# Altium integrated library OMID_DXP_LIB93.IntLib: 684 symbols (part 4 of 5) (continued)
## STM32F103CBT6 (continued)

## STM32F103RBT6
designator U?
STM32 ARM-based 32-bit MCU with 128 Kbytes Flash, 64-pin LQFP, Industrial Temperature; Published: 30-May-2008; DatasheetVersion: rev6, Mar-2008; PackageVersion: Mar-2008; PackageReference: LQFP64; Publisher: Altium Limited; PackageDescription: 64-Pin Low-Profile Quad Flat Pack, 10 x 10 mm Body, 0.5 mm Pitch (LQFP64); ComponentLink1Description: Manufacturer Link; ComponentLink1URL: www.st.com/stm32; ComponentLink2Description: Datasheet; ComponentLink2URL: http://www.st.com/stonline/products/literature/ds/13587.pdf
footprint LQFP64_N (Thin QFP, 64-Leads, Body 10x10mm, Pitch 0.5mm, IPC Medium Density)
footprint LQFP64_L (Thin QFP, 64-Leads, Body 10x10mm, Pitch 0.5mm, IPC High Density)
footprint LQFP64_M (Thin QFP, 64-Leads, Body 10x10mm, Pitch 0.5mm, IPC Low Density)
pins: 1 VBAT (power), 2 PC13-TAMPER-RTC (io), 3 PC14-OSC32_IN (io), 4 PC15-OSC32_OUT (io), 5 OSC_IN/PD0 (in), 6 OSC_OUT/PD1 (out), 7 NRST (io), 8 ADC10/PC0 (io), 9 ADC11/PC1 (io), 10 ADC12/PC2 (io), 11 ADC13/PC3 (io), 12 VSSA (power), 13 VDDA (power), 14 PA0/ADC0/TIM2-1/WKUP (io), 15 PA1/ADC1/TIM2-2 (io), 16 PA2/ADC2/TIM2-3 (io), 17 PA3/ADC3/TIM2-4/RX2 (io), 18 VSS_4 (power), 19 VDD_4 (power), 20 PA4/ADC4/SS1 (io), 21 PA5/ADC5/SCK1 (io), 22 PA6/ADC6/TIM3-1/MI1 (io), 23 PA7/ADC7/TIM3-2/MO1 (io), 24 ADC14/PC4 (io), 25 ADC15/PC5 (io), 26 ADC8/TIM3/B0 (io), 27 ADC9/TIM3-4/PB1 (io), 28 PB2/BOOT1 (io), 29 SCL2/TX3/TIM2-3/PB10 (io), 30 SDA2/RX3/TIM2-4/PB11 (io), 31 VSS_1 (power), 32 VDD_1 (power), 33 SS2/PB12 (io), 34 SCK2/TIM1-1/PB13 (io), 35 MISO2/TIM1-2/PB14 (io), 36 MOSI2/TIM1-3/PB15 (io), 37 PC6/TIM3-1 (io), 38 PC7/TIM3-2 (io), 39 PC8/TIM3-3 (io), 40 PC9/TIM3-4 (io), 41 PA8/TIM1-1 (io), 42 PA9/TIM1-2/TX1 (io), 43 PA10/TIM1-3/RX1 (io), 44 PA11/TIM1-2/DM (io), 45 PA12/USB-DP (io), 46 PA13/JTMS/SWDIO (io), 47 VSS_2 (power), 48 VDD_2 (power), 49 PA14/JTCK/SWCLK (io), 50 PA15/JTDI (io), 51 PC10/TX3 (io), 52 PC11/RX3 (io), 53 PC12 (io), 54 PD2 (io), 55 PB3/JTDO (io), 56 PB4/JNTRST (io), 57 PB5/TIM3-2 (io), 58 PB6/SCL1-TIM4-1 (io), 59 PB7/SDA1-TIM4-2 (io), 60 BOOT0 (in), 61 PB8/TIM4-3/CAN-RX (io), 62 PB9/TIM4-4/CAN-TX (io), 63 VSS_3 (power), 64 VDD_3 (power)

## STM32F103TBU6
designator U?
STM32 ARM-based 32-bit MCU with 128 Kbytes Flash, 36pin LQFP, Industrial Temperature; Published: 30-May-2016; DatasheetVersion: rev6, Mar-2016; PackageVersion: Mar-2008; PackageReference: QFNP36; Publisher: Altium Limited; PackageDescription: 36-Pin Low-Profile Quad Flat Pack, 6 x 6 mm Body, 0.5 mm Pitch (QFN36); ComponentLink1Description: Manufacturer Link; ComponentLink1URL: www.st.com/stm32; ComponentLink2Description: Datasheet; ComponentLink2URL: http://www.st.com/stonline/products/literature/ds/13587.pdf
footprint QFN36 (QFN, 36-Leads, Body 6x6mm, Pitch 0.5mm, IPC High Density)
pins: 1 VDD_3 (power), 2 OSC_IN/PD0 (in), 3 OSC_OUT/PD1 (out), 4 NRST (io), 5 VSS_A (power), 6 VDD_A (power), 7 PA0/WKUP/UART2_CTS/ADC12_IN0/TIM2_CH1_ETR (io), 8 PA1/UART2_RTS/ADC12_IN1/TIM2_CH3 (io), 9 PA2/UART2_TX/ADC12_IN2/TIM2_CH3 (io), 10 PA3/UART2_RX/ADC12_IN3/TIM2_CH4 (io), 11 PA4/SPI1_NSS/UART2_CK/ADC12_IN4 (io), 12 PA5/SPI1_SCK/ADC12_IN5 (io), 13 PA6/SPI1_MISO/ADC12_IN6/TIM3_CH1/TIM1_BKIN (io), 14 PA7/SPI1_MOSI/ADC12_IN7/TIM3_CH2/TIM1_CH1N (io), 15 PB0/ADC12_IN8/TIM3_CH3/TIM1_CH2N (io), 16 PB1/ADC12_IN9/TIM3_CH4/TIM1_CH3N (io), 17 PB2/BOOT1 (io), 18 VSS_1 (power), 19 VDD_1 (power), 20 PA8/UART1_CK/TIM1_CH1/MCO (io), 21 PA9/UART1_TX/TIM1_CH2 (io), 22 PA10/UART1_RX/TIM1_CH3 (io), 23 PA11/UART1_CTS/USBDM/CAN_RX/TIM1_CH4 (io), 24 PA12/UART1_RTS/USNDP/CAN_TX/TIM1_ETR (io), 25 PA13/JTMS/SWDIO (io), 26 VSS_2 (power), 27 VDD_2 (power), 28 PA14/JTCK/SWCLK (io), 29 PA15/JTDI/TIM2_CH1_ETR/SPI1_NSS (io), 30 PB3/JTDO/TIM2_CH2/SPI1_SCK (io), 31 PB4/NJTRST/TIM3_CH1/SPI1_MISO (io), 32 PB5/I2C1_SMBAI/TIM3_CH2/SPI1_MOSI (io), 33 PB6/I2C1_SCL/TIM4_CH1/UART1_TX (io), 34 PB7/I2C1_SDA/TIM4_CH2/UART1_RX (io), 35 BOOT0 (in), 36 VSS_3 (power)

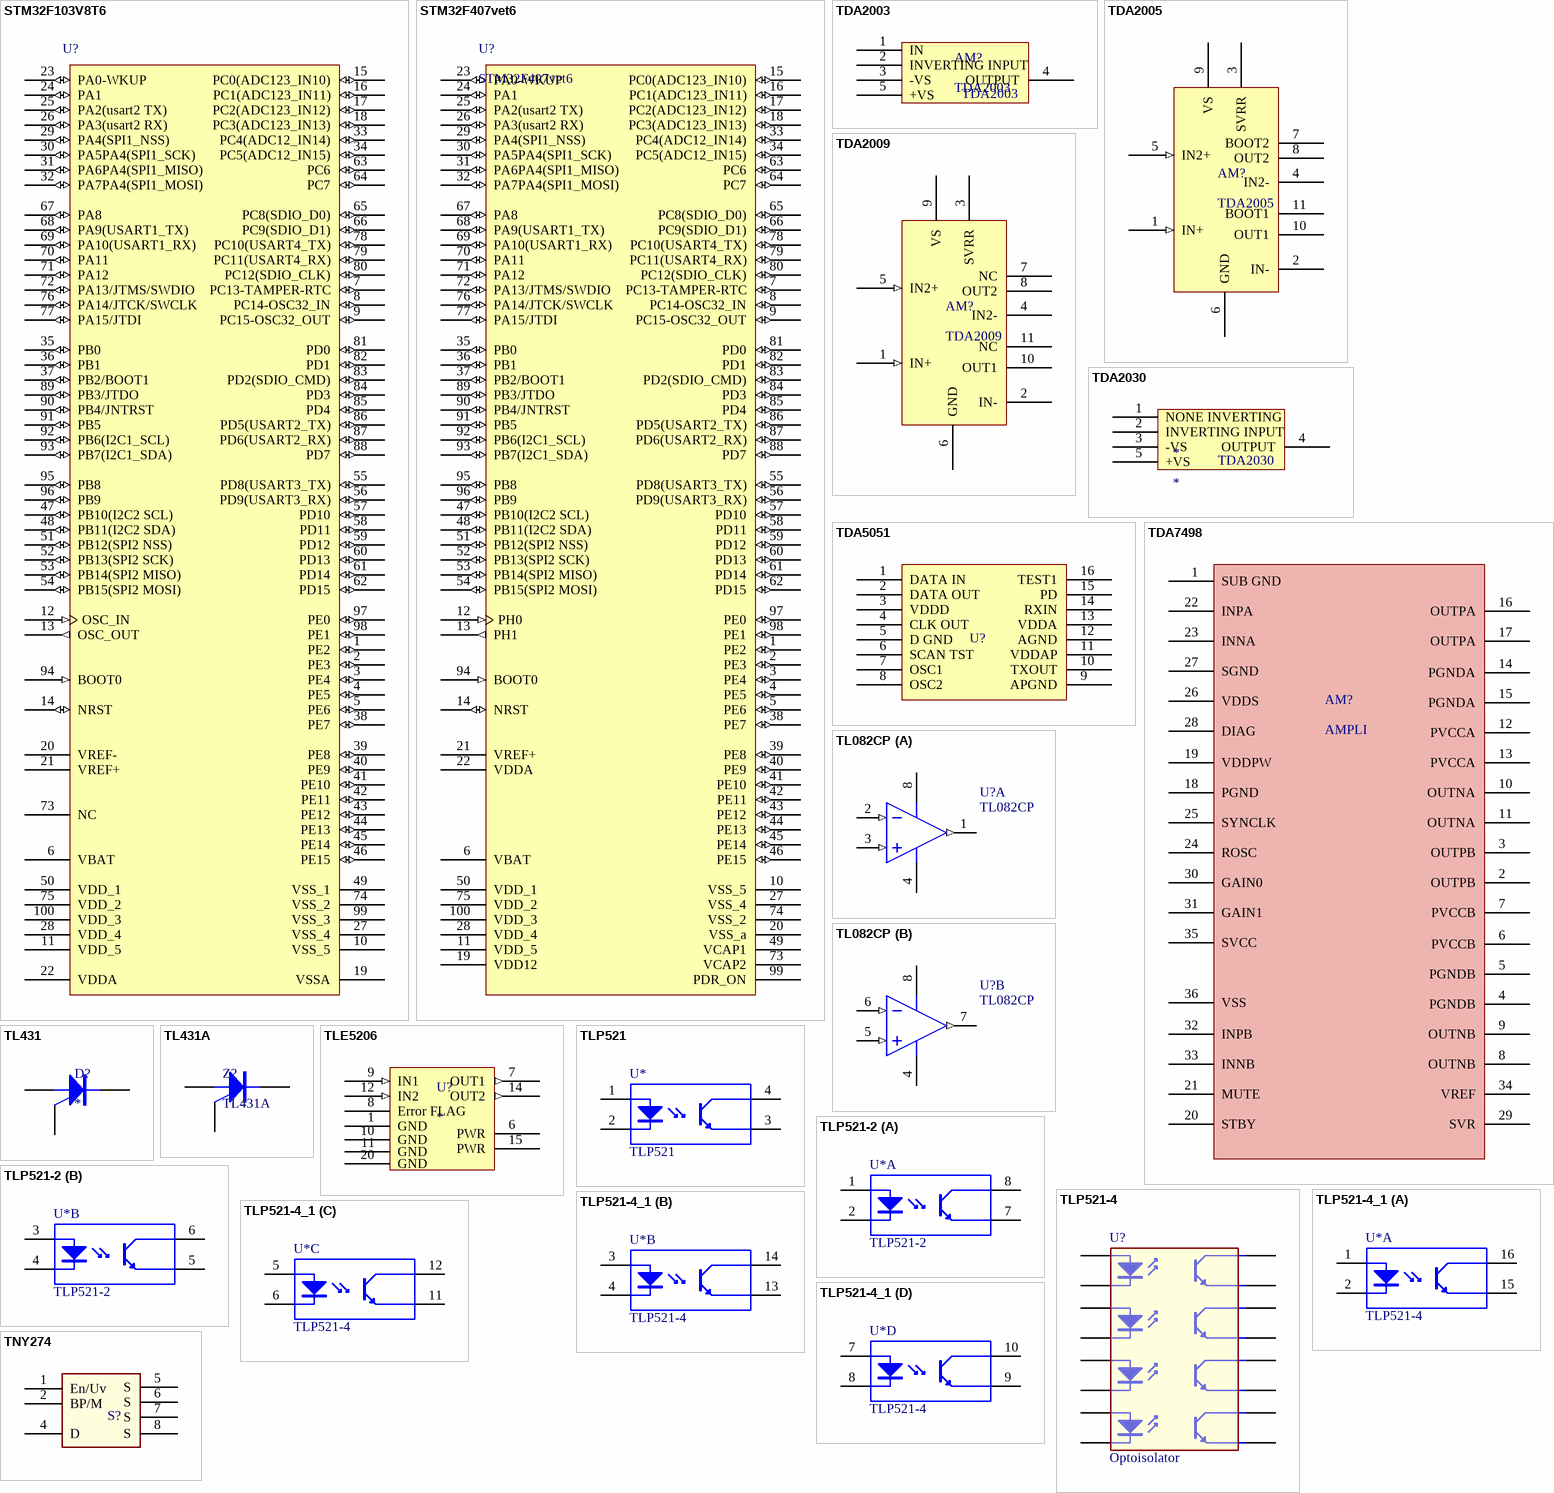
[diagram p26: symbols STM32F103V8T6 to TNY274]

## STM32F103V8T6
designator U?
STM32 ARM-based 32-bit MCU with 64 Kbytes Flash, 100-pin LQFP, Industrial Temperature; Published: 30-May-2008; DatasheetVersion: rev6, Mar-2008; PackageVersion: Mar-2008; PackageReference: LQFP100; Publisher: Altium Limited; PackageDescription: 100-Pin Low-Profile Quad Flat Pack, 14 x 14 mm Body, 0.5 mm Pitch (LQFP100); ComponentLink1Description: Manufacturer Link; ComponentLink1URL: www.st.com/stm32; ComponentLink2Description: Datasheet; ComponentLink2URL: http://www.st.com/stonline/products/literature/ds/13587.pdf
footprint LQFP100_N (Thin QFP, 100-Leads, Body 14x14mm, Pitch 0.5mm, IPC Medium Density)
footprint LQFP100_L (Thin QFP, 100-Leads, Body 14x14mm, Pitch 0.5mm, IPC High Density)
footprint LQFP100_M (Thin QFP, 100-Leads, Body 14x14mm, Pitch 0.5mm, IPC Low Density)
pins: 1 PE2 (io), 2 PE3 (io), 3 PE4 (io), 4 PE5 (io), 5 PE6 (io), 6 VBAT (power), 7 PC13-TAMPER-RTC (io), 8 PC14-OSC32_IN (io), 9 PC15-OSC32_OUT (io), 10 VSS_5 (power), 11 VDD_5 (power), 12 OSC_IN (in), 13 OSC_OUT (out), 14 NRST (io), 15 PC0(ADC123_IN10) (io), 16 PC1(ADC123_IN11) (io), 17 PC2(ADC123_IN12) (io), 18 PC3(ADC123_IN13) (io), 19 VSSA (power), 20 VREF- (power), 21 VREF+ (power), 22 VDDA (power), 23 PA0-WKUP (io), 24 PA1 (io), 25 PA2(usart2 TX) (io), 26 PA3(usart2 RX) (io), 27 VSS_4 (power), 28 VDD_4 (power), 29 PA4(SPI1_NSS) (io), 30 PA5PA4(SPI1_SCK) (io), 31 PA6PA4(SPI1_MISO) (io), 32 PA7PA4(SPI1_MOSI) (io), 33 PC4(ADC12_IN14) (io), 34 PC5(ADC12_IN15) (io), 35 PB0 (io), 36 PB1 (io), 37 PB2/BOOT1 (io), 38 PE7 (io), 39 PE8 (io), 40 PE9 (io), 41 PE10 (io), 42 PE11 (io), 43 PE12 (io), 44 PE13 (io), 45 PE14 (io), 46 PE15 (io), 47 PB10(I2C2 SCL) (io), 48 PB11(I2C2 SDA) (io), 49 VSS_1 (power), 50 VDD_1 (power), 51 PB12(SPI2 NSS) (io), 52 PB13(SPI2 SCK) (io), 53 PB14(SPI2 MISO) (io), 54 PB15(SPI2 MOSI) (io), 55 PD8(USART3_TX) (io), 56 PD9(USART3_RX) (io), 57 PD10 (io), 58 PD11 (io), 59 PD12 (io), 60 PD13 (io), 61 PD14 (io), 62 PD15 (io), 63 PC6 (io), 64 PC7 (io), 65 PC8(SDIO_D0) (io), 66 PC9(SDIO_D1) (io), 67 PA8 (io), 68 PA9(USART1_TX) (io), 69 PA10(USART1_RX) (io), 70 PA11 (io), 71 PA12 (io), 72 PA13/JTMS/SWDIO (io), 73 NC, 74 VSS_2 (power), 75 VDD_2 (power), 76 PA14/JTCK/SWCLK (io), 77 PA15/JTDI (io), 78 PC10(USART4_TX) (io), 79 PC11(USART4_RX) (io), 80 PC12(SDIO_CLK) (io), 81 PD0 (io), 82 PD1 (io), 83 PD2(SDIO_CMD) (io), 84 PD3 (io), 85 PD4 (io), 86 PD5(USART2_TX) (io), 87 PD6(USART2_RX) (io), 88 PD7 (io), 89 PB3/JTDO (io), 90 PB4/JNTRST (io), 91 PB5 (io), 92 PB6(I2C1_SCL) (io), 93 PB7(I2C1_SDA) (io), 94 BOOT0 (in), 95 PB8 (io), 96 PB9 (io), 97 PE0 (io), 98 PE1 (io), 99 VSS_3 (power), 100 VDD_3 (power)

## STM32F407vet6
designator U?
STM32 ARM-based 32-bit MCU with 64 Kbytes Flash, 100-pin LQFP, Industrial Temperature; Published: 30-May-2008; DatasheetVersion: rev6, Mar-2008; PackageVersion: Mar-2008; PackageReference: LQFP100; Publisher: Altium Limited; PackageDescription: 100-Pin Low-Profile Quad Flat Pack, 14 x 14 mm Body, 0.5 mm Pitch (LQFP100); ComponentLink1Description: Manufacturer Link; ComponentLink1URL: www.st.com/stm32; ComponentLink2Description: Datasheet; ComponentLink2URL: http://www.st.com/stonline/products/literature/ds/13587.pdf
footprint LQFP100_N (Thin QFP, 100-Leads, Body 14x14mm, Pitch 0.5mm, IPC Medium Density)
footprint LQFP100_L (Thin QFP, 100-Leads, Body 14x14mm, Pitch 0.5mm, IPC High Density)
footprint LQFP100_M (Thin QFP, 100-Leads, Body 14x14mm, Pitch 0.5mm, IPC Low Density)
pins: 1 PE2 (io), 2 PE3 (io), 3 PE4 (io), 4 PE5 (io), 5 PE6 (io), 6 VBAT (power), 7 PC13-TAMPER-RTC (io), 8 PC14-OSC32_IN (io), 9 PC15-OSC32_OUT (io), 10 VSS_5 (power), 11 VDD_5 (power), 12 PH0 (in), 13 PH1 (out), 14 NRST (io), 15 PC0(ADC123_IN10) (io), 16 PC1(ADC123_IN11) (io), 17 PC2(ADC123_IN12) (io), 18 PC3(ADC123_IN13) (io), 19 VDD12 (power), 20 VSS_a (power), 21 VREF+ (power), 22 VDDA (power), 23 PA0-WKUP (io), 24 PA1 (io), 25 PA2(usart2 TX) (io), 26 PA3(usart2 RX) (io), 27 VSS_4 (power), 28 VDD_4 (power), 29 PA4(SPI1_NSS) (io), 30 PA5PA4(SPI1_SCK) (io), 31 PA6PA4(SPI1_MISO) (io), 32 PA7PA4(SPI1_MOSI) (io), 33 PC4(ADC12_IN14) (io), 34 PC5(ADC12_IN15) (io), 35 PB0 (io), 36 PB1 (io), 37 PB2/BOOT1 (io), 38 PE7 (io), 39 PE8 (io), 40 PE9 (io), 41 PE10 (io), 42 PE11 (io), 43 PE12 (io), 44 PE13 (io), 45 PE14 (io), 46 PE15 (io), 47 PB10(I2C2 SCL) (io), 48 PB11(I2C2 SDA) (io), 49 VCAP1 (power), 50 VDD_1 (power), 51 PB12(SPI2 NSS) (io), 52 PB13(SPI2 SCK) (io), 53 PB14(SPI2 MISO) (io), 54 PB15(SPI2 MOSI) (io), 55 PD8(USART3_TX) (io), 56 PD9(USART3_RX) (io), 57 PD10 (io), 58 PD11 (io), 59 PD12 (io), 60 PD13 (io), 61 PD14 (io), 62 PD15 (io), 63 PC6 (io), 64 PC7 (io), 65 PC8(SDIO_D0) (io), 66 PC9(SDIO_D1) (io), 67 PA8 (io), 68 PA9(USART1_TX) (io), 69 PA10(USART1_RX) (io), 70 PA11 (io), 71 PA12 (io), 72 PA13/JTMS/SWDIO (io), 73 VCAP2 (power), 74 VSS_2 (power), 75 VDD_2 (power), 76 PA14/JTCK/SWCLK (io), 77 PA15/JTDI (io), 78 PC10(USART4_TX) (io), 79 PC11(USART4_RX) (io), 80 PC12(SDIO_CLK) (io), 81 PD0 (io), 82 PD1 (io), 83 PD2(SDIO_CMD) (io), 84 PD3 (io), 85 PD4 (io), 86 PD5(USART2_TX) (io), 87 PD6(USART2_RX) (io), 88 PD7 (io), 89 PB3/JTDO (io), 90 PB4/JNTRST (io), 91 PB5 (io), 92 PB6(I2C1_SCL) (io), 93 PB7(I2C1_SDA) (io), 94 BOOT0 (in), 95 PB8 (io), 96 PB9 (io), 97 PE0 (io), 98 PE1 (io), 99 PDR_ON (power), 100 VDD_3 (power)

## TDA2003
designator AM?
28 VOLT AMPLIFIRE
footprint t05a sleep
footprint T05A (TO, Thru-Hole, Vertical, Heatsink Mounted; 5 In-Line Leads; Pitch 1.70 mm)
pins: 1 IN, 2 INVERTING INPUT, 3 -VS, 4 OUTPUT, 5 +VS

## TDA2005
designator AM?
class B dual audio power  amplifier 28VOLT
footprint Multiwatt11
pins: 1 IN+ (in), 2 IN-, 3 SVRR, 4 IN2-, 5 IN2+ (in), 6 GND (power), 7 BOOT2, 8 OUT2, 9 VS (power), 10 OUT1, 11 BOOT1

## TDA2009
designator AM?
class B dual audio power  amplifier 28VOLT
footprint Multiwatt11
pins: 1 IN+ (in), 2 IN-, 3 SVRR, 4 IN2-, 5 IN2+ (in), 6 GND (power), 7 NC, 8 OUT2, 9 VS (power), 10 OUT1, 11 NC

## TDA2030
designator *
footprint TDA2030
pins: 1 NONE INVERTING, 2 INVERTING INPUT, 3 -VS, 4 OUTPUT, 5 +VS

## TDA5051
designator U?  (value not drawn)
Home automation modem
footprint SOSIC-16
pins: 1 DATA IN, 2 DATA OUT, 3 VDDD, 4 CLK OUT, 5 D GND, 6 SCAN TST, 7 OSC1, 8 OSC2, 9 APGND, 10 TXOUT, 11 VDDAP, 12 AGND, 13 VDDA, 14 RXIN, 15 PD, 16 TEST1

## TDA7498
designator AM?, comment AMPLI
100-watt + 100-watt dual BTL class-D audio amplifier
footprint PSSOP36
pins: 1 SUB GND, 2 OUTPB, 3 OUTPB, 4 PGNDB, 5 PGNDB, 6 PVCCB, 7 PVCCB, 8 OUTNB, 9 OUTNB, 10 OUTNA, 11 OUTNA, 12 PVCCA, 13 PVCCA, 14 PGNDA, 15 PGNDA, 16 OUTPA, 17 OUTPA, 18 PGND, 19 VDDPW, 20 STBY, 21 MUTE, 22 INPA, 23 INNA, 24 ROSC, 25 SYNCLK, 26 VDDS, 27 SGND, 28 DIAG, 29 SVR, 30 GAIN0, 31 GAIN1, 32 INPB, 33 INNB, 34 VREF, 35 SVCC, 36 VSS

## TL082CP
designator U?
JFET-Input Operational Amplifier; Published: 17-Jul-2002; LatestRevisionDate: 06-Jun-2005; LatestRevisionNote: Stylized 3D Model Added.; DatasheetVersion: 1988; PackageReference: 626-05; Publisher: Altium Limited; PackageDescription: DIP; 8 Leads; Row Spacing 7.62 mm; Pitch 2.54 mm; ComponentLink1Description: Manufacturer Link; ComponentLink1URL: http://www.onsemi.com/site/products/parametrics/0,4446,251,00.html
footprint 626-05 (DIP; 8 Leads; Row Spacing 7.62 mm; Pitch 2.54 mm)
3D model 626-05 (DIP; 8 Leads; Row Spacing 7.62 mm; Pitch 2.54 mm)
footprint 751-02_L (SOIC, 8-Leads, Body 4.9x3.9mm, Pitch 1.27mm, IPC High Density)
pins on every part: 4 V- (power), 8 V+ (power)
part A pins: 1 OUT (out), 2 IN- (in), 3 IN+ (in)
part B pins: 5 IN+ (in), 6 IN- (in), 7 OUT (out)

## TL431
designator D?
footprint SO-8_M (SOIC, 8-Leads, Body 4.9x3.9mm, Pitch 1.27mm, IPC Low Density)
pins: 1 K, 2 A, 3 A hidden to 2, 6 A hidden to 2, 7 A hidden to 2, 8 REF

## TL431A
designator Z?
TL431 Programmable Shunt Regulator
footprint BCY-W3/E4 (TO, Flat Index; 3 In-Line, Axial Leads; Body Dia. 4.5mm; Leads 0.51 x 0.48 mm (max))
pins: 1 REF, 2 A, 3 K

## TLE5206
designator U?
5-A H-Bridge for DC-Motor
footprint P-DSO-20-12
pins: 1 GND, 6 PWR, 7 OUT1 (out), 8 Error FLAG, 9 IN1 (in), 10 GND (power), 11 GND, 12 IN2 (in), 14 OUT2 (out), 15 PWR, 20 GND

## TLP521
designator U*
HIGH DENSITY MOUNTING PHOTOTRANSISTOR OPTICALLY COUPLED ISOLATORS; Company: IPA Co.; Creator: Saeid Jorablo; Creation Date: 1387-1-26
footprint DIP-4 (DIP; 4 Leads; Row Spacing 7.62 mm; Pitch 2.54 mm)
pins: 1 A, 2 K, 3 E, 4 C

## TLP521-2
designator U*
HIGH DENSITY MOUNTING PHOTOTRANSISTOR OPTICALLY COUPLED ISOLATORS; Company: IPA CO.; Creator: Saeid Jorablo; Creation Date: 1387-1-26
footprint DIP8
part A pins: 1 A, 2 K, 7 E, 8 C
part B pins: 3 A, 4 K, 5 E, 6 C

## TLP521-4
designator U?, comment Optoisolator
4 Optoisolator's
footprint My_DIP-16
pins: 1 A, 2 K, 3 A, 4 K, 5 A, 6 K, 7 A, 8 K, 9 E, 10 C, 11 E, 12 C, 13 E, 14 C, 15 E, 16 C

## TLP521-4_1
designator U*, comment TLP521-4
HIGH DENSITY MOUNTING PHOTOTRANSISTOR OPTICALLY COUPLED ISOLATORS; Company: IPA CO.; Creator: Saeid Jorablo; Creation Date: 1387-1-26; ComponentLink1Description: datasheet - pdf; ComponentLink1URL: *; ComponentLink2Description: appnote
footprint DIP16
part A pins: 1 A, 2 K, 15 E, 16 C
part B pins: 3 A, 4 K, 13 E, 14 C
part C pins: 5 A, 6 K, 11 E, 12 C
part D pins: 7 A, 8 K, 9 E, 10 C

## TNY274
designator S?
TNY SWITCHING DIP PACKAGE
footprint My_TNY
pins: 1 En/Uv (hiz), 2 BP/M, 4 D, 5 S, 6 S, 7 S (oc), 8 S

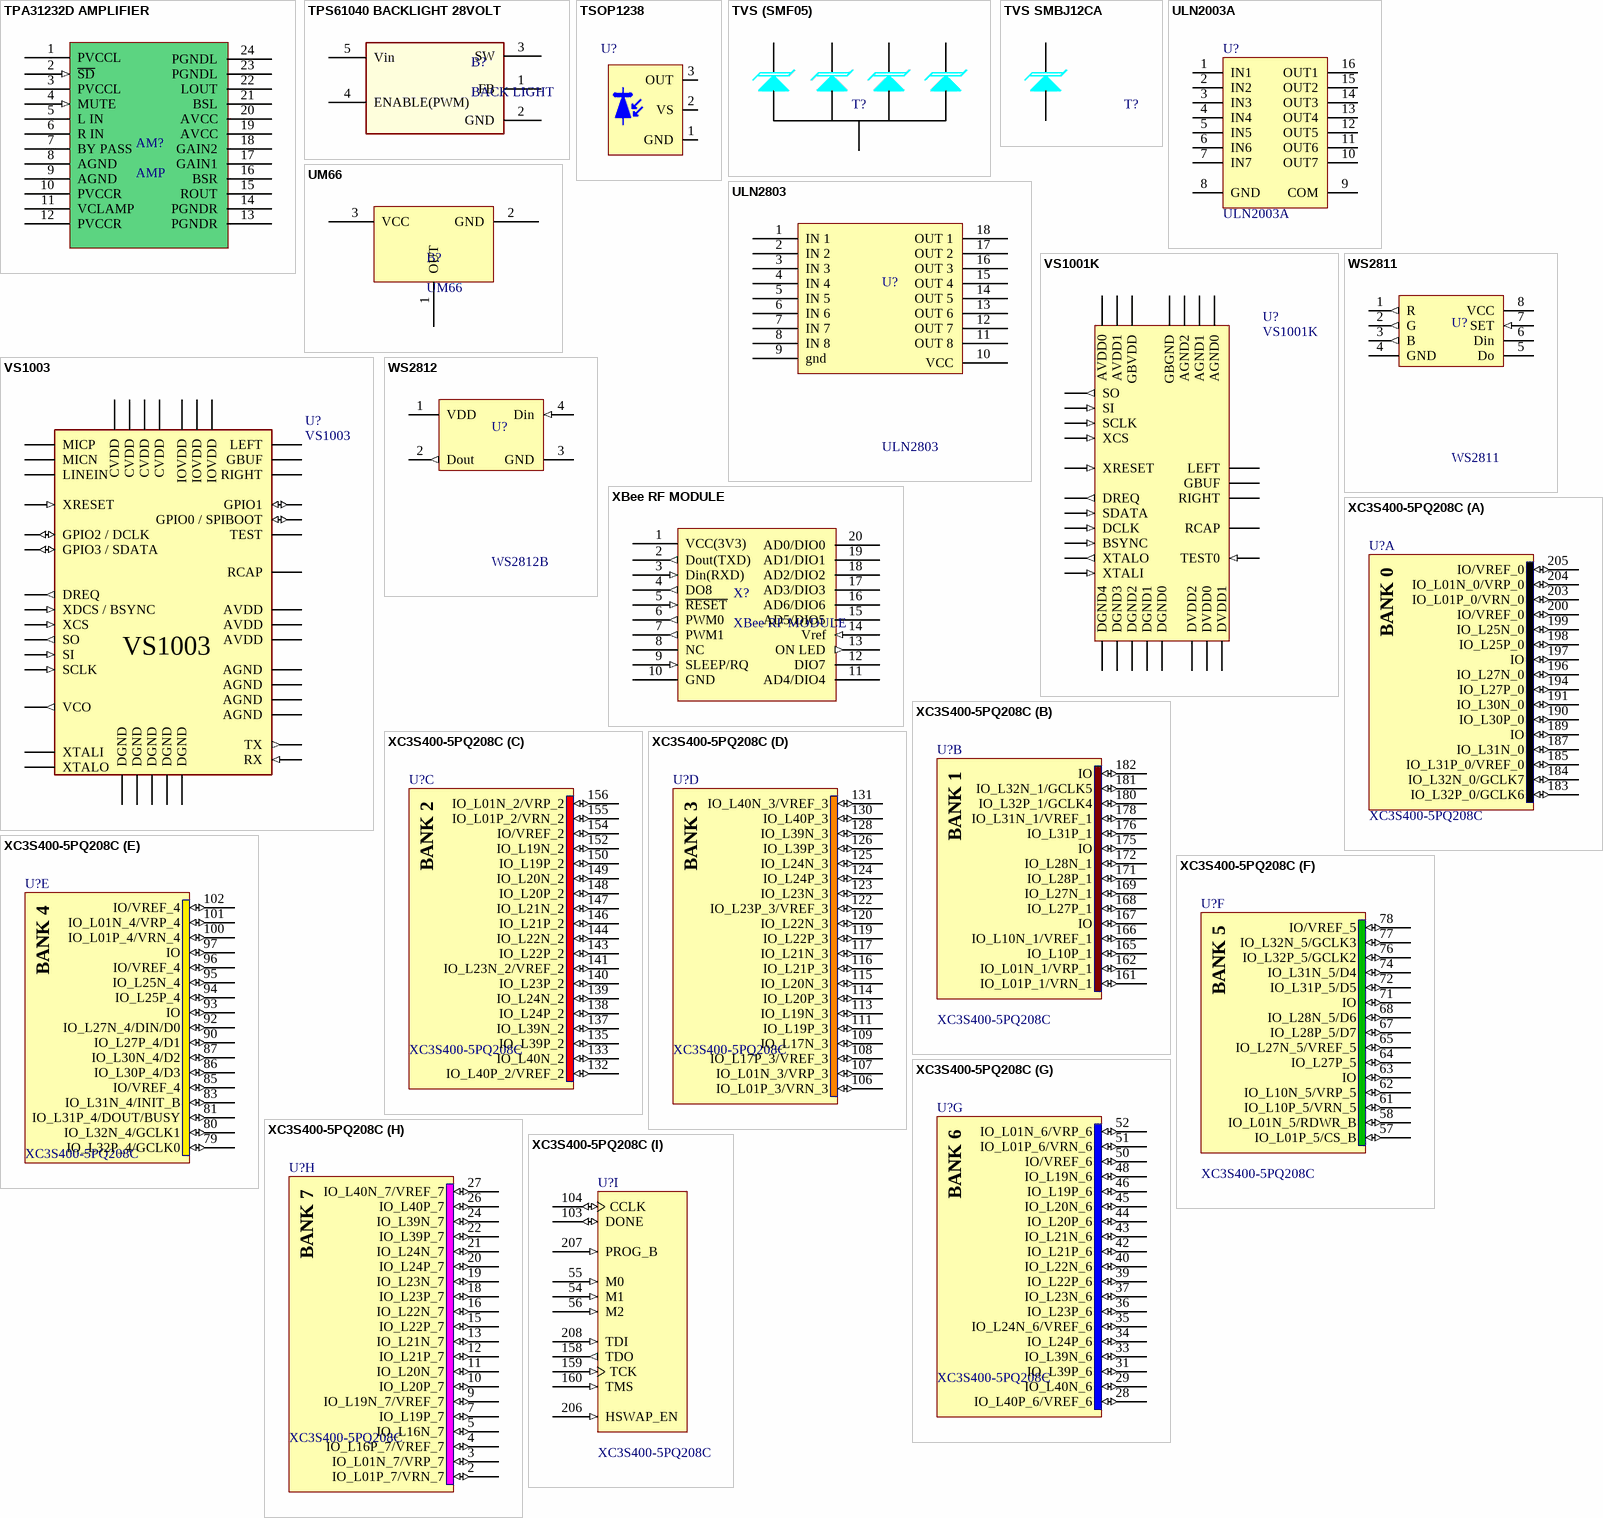
[diagram p27: symbols TPA31232D AMPLIFIER to XC3S400-5PQ208C]

## TPA31232D AMPLIFIER
designator AM?, comment AMP
25-W STEREO CLASS-D AUDIO POWER AMPLIFIER
footprint HTSSOP-24
pins: 1 PVCCL (power), 2 ~{SD} (in), 3 PVCCL (power), 4 MUTE (in), 5 L IN, 6 R IN, 7 BY PASS, 8 AGND (power), 9 AGND (power), 10 PVCCR (power), 11 VCLAMP, 12 PVCCR (power), 13 PGNDR (power), 14 PGNDR (power), 15 ROUT, 16 BSR, 17 GAIN1, 18 GAIN2, 19 AVCC (power), 20 AVCC (power), 21 BSL, 22 LOUT, 23 PGNDL (power), 24 PGNDL (power)